# Altium footprint library PcbLib1.PcbLib: 50 footprints (part 3 of 4)
Each footprint in its own frame and in the unit in brackets; x right, y up, seen from the top. Pads: shape width x height; smd on the part's side, far side on the other; paste and mask are expansions set on the pad; w line width, h text height; cw(c..) or ccw(c..) is an arc to the next point about the centre after c.
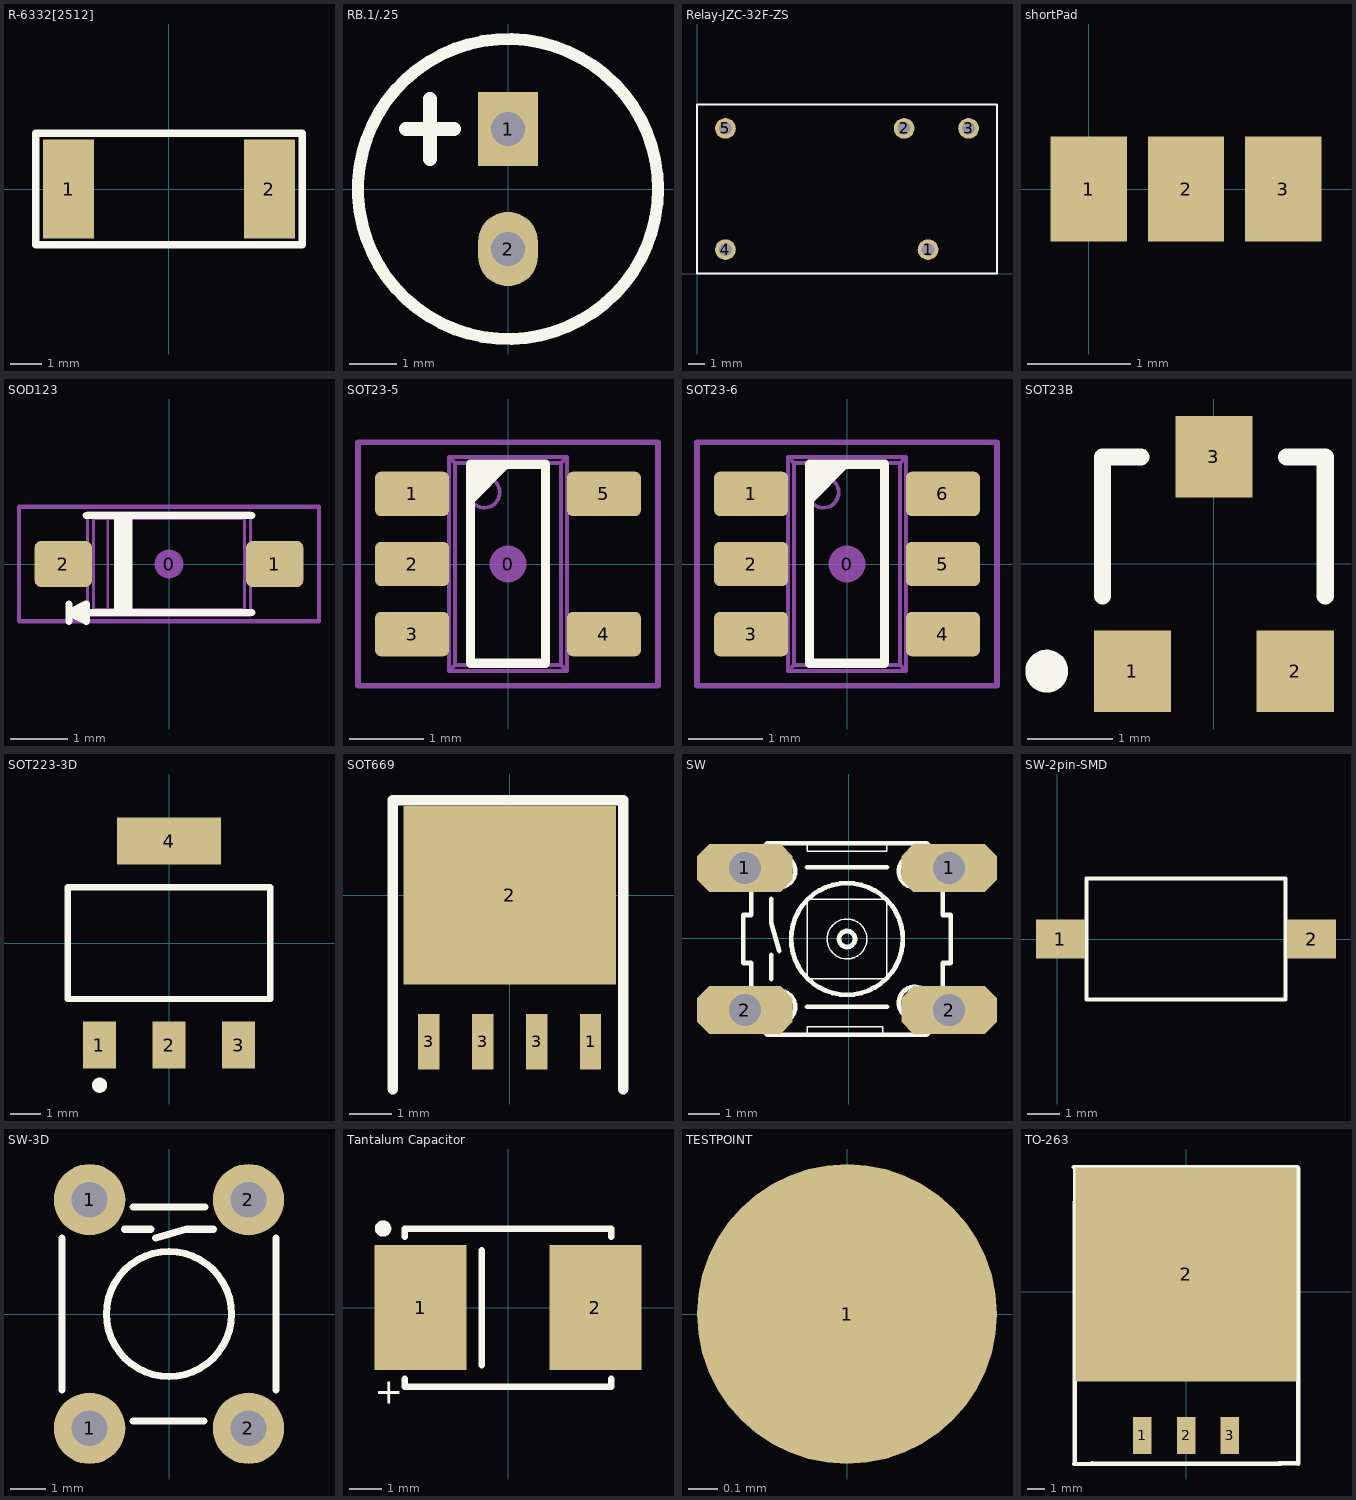
[diagram p2: the footprints below, top view; thin cyan lines are the x and y axes]

## R-6332[2512] [mm] "贴片电阻2512 size6.35*3.2mm"
height 0.65
pads (2):
  rect 1.65x3.2 smd: 1(-3.24,0) 2(3.24,0)
Top Overlay:
  lines w0.254: 4.3,-1.8 -4.3,-1.8 -4.3,1.8 4.3,1.8 ; 4.3,-1.75 4.3,1.75
3D body: height 0.6, standoff -0.04, extent -3.4,-1.651 3.4,1.649

## RB.1/.25 [mil]
pads (2):
  rect 50x62 hole 28: 1(0,50)
  oval 50x62 hole 28: 2(0,-50)
Top Overlay:
  circle w10: c0,0 r125
  lines w12: -85,50 -45,50 ; -65,25 -65,75

## Relay-JZC-32F-ZS [mm]
pads (5):
  round 1.3 hole 0.8: 1(14.48,1.5) 2(12.98,9.1) 3(17.02,9.1) 4(1.78,1.5) 5(1.78,9.1)
Top Overlay:
  lines w0.127: 18.8,10.596 18.8,0 0,0 0,10.6 18.8,10.6

## shortPad [mil] "short pad"
height 10
pads (3):
  rect 29x40 smd: 1(0,0) 2(37,0) 3(74,0)

## SOD123 [mm] "SOD-123; 2 Leads; Body 2.7 x 1.6 mm, (LxW)"
height 1.35
pads (3):
  round 0.508 on Mech15: 0(0,0)
  rrect25% 1x0.8 smd: 1(1.85,0) 2(-1.85,0)
Top Overlay:
  lines w0.127: -1.75,-1 -1.75,-0.7 ; -1.45,0.85 1.45,0.85 ; -0.9,-0.85 -0.9,0.85 ; -0.8,-0.85 -0.8,0.85 ; -0.7,-0.85 -0.7,0.85 ; 1.448,-0.85 -1.45,-0.85 -1.75,-0.85 ; -1.75,-0.85 -1.45,-1 -1.45,-0.7 -1.75,-0.85
Mechanical 13:
  lines w0.05: -1.766,-0.308 -1.766,0.308 ; -1.707,-0.308 -1.707,0.308 ; -1.517,-0.308 -1.517,0.308 ; -1.425,-0.308 -1.95,-0.308 -1.95,0.308 -1.425,0.308 ; 1.425,-0.308 1.95,-0.308 1.95,0.308 1.425,0.308 ; 1.517,-0.308 1.517,0.308 ; 1.707,-0.308 1.707,0.308 ; 1.766,-0.308 1.766,0.308 ; -1.425,-0.9 1.425,-0.9 ; -1.425,-0.9 -1.323,-0.798 ; -1.425,-0.9 -1.425,0.9 ; -1.425,0.9 -1.323,0.798 ; -1.425,0.9 1.425,0.9 ; -1.323,-0.798 -1.072,-0.798 ; -1.323,-0.798 -1.323,0.798 ; -1.323,0.798 -1.072,0.798 ; -1.072,-0.798 1.322,-0.797 ; -1.072,-0.798 -1.072,0.798 ; -1.072,0.798 1.322,0.797 ; 1.322,-0.797 1.322,0.797 ; 1.322,-0.797 1.425,-0.9 ; 1.322,0.797 1.425,0.9 ; 1.425,-0.9 1.425,0.9
Mechanical 15:
  lines w0.076: -2.625,-1 2.625,-1 2.625,1 -2.625,1 -2.625,-1
3D body: height 1.18, standoff 0, extent -1.95,-0.9 1.95,0.9

## SOT23-5 [mm]
height 1.6
pads (6):
  round 0.5 on Mech15: 0(0,0)
  rrect25% 1x0.6 smd: 1(-1.3,0.95) 2(-1.3,0) 3(-1.3,-0.95) 4(1.3,-0.95) 5(1.3,0.95)
Top Overlay:
  region: -0.508,1.353 0.053,1.353 -0.508,0.792
  lines w0.127: -0.508,-1.347 -0.508,1.353 0.508,1.353 0.508,-1.347 -0.508,-1.347
  text "." at -2.275,0.95 h0.1
Mechanical 13:
  circle w0.05: c-0.32,0.97 r0.208
  lines w0.05: -1.191,-1.15 -1.191,-0.75 ; -1.191,-0.2 -1.191,0.2 ; -1.191,0.75 -1.191,1.15 ; -1.1,-1.15 -1.1,-0.75 ; -1.1,-0.2 -1.1,0.2 ; -1.1,0.75 -1.1,1.15 ; -1.094,-1.15 -1.094,-0.75 ; -1.094,-0.2 -1.094,0.2 ; -1.094,0.75 -1.094,1.15 ; -0.844,-1.15 -0.844,-0.75 ; -0.844,-0.2 -0.844,0.2 ; -0.844,0.75 -0.844,1.15 ; -0.8,-1.15 -1.4,-1.15 -1.4,-0.75 -0.8,-0.75 ; -0.8,-0.2 -1.4,-0.2 -1.4,0.2 -0.8,0.2 ; -0.8,0.75 -1.4,0.75 -1.4,1.15 -0.8,1.15 ; 0.8,-1.15 1.4,-1.15 1.4,-0.75 0.8,-0.75 ; 0.8,0.75 1.4,0.75 1.4,1.15 0.8,1.15 ; 0.844,-1.15 0.844,-0.75 ; 0.844,0.75 0.844,1.15 ; 1.094,-1.15 1.094,-0.75 ; 1.094,0.75 1.094,1.15 ; 1.1,-1.15 1.1,-0.75 ; 1.1,0.75 1.1,1.15 ; 1.191,-1.15 1.191,-0.75 ; 1.191,0.75 1.191,1.15 ; -0.8,-1.45 -0.8,1.45 ; -0.8,-1.45 -0.719,-1.369 ; -0.8,-1.45 0.8,-1.45 ; -0.8,1.45 -0.719,1.369 ; -0.8,1.45 0.8,1.45 ; -0.719,-1.369 0.719,-1.369 ; -0.719,-1.369 -0.719,1.369 ; -0.719,1.369 0.719,1.369 ; 0.719,-1.369 0.8,-1.45 ; 0.719,-1.369 0.719,1.369 ; 0.719,1.369 0.8,1.45 ; 0.8,-1.45 0.8,1.45
Mechanical 15:
  lines w0.076: -2.032,-1.651 -2.032,1.651 2.032,1.651 2.032,-1.651 -2.032,-1.651
3D body: height 1.44, standoff -0.01, extent -1.4,-1.45 1.4,1.45

## SOT23-6 [mm]
height 1.6
pads (7):
  round 0.5 on Mech15: 0(0,0)
  rrect25% 1x0.6 smd: 1(-1.3,0.95) 2(-1.3,0) 3(-1.3,-0.95) 4(1.3,-0.95) 5(1.3,0) 6(1.3,0.95)
Top Overlay:
  region: -0.508,1.353 0.053,1.353 -0.508,0.792
  lines w0.127: -0.508,-1.347 0.508,-1.347 0.508,1.353 -0.508,1.353 -0.508,-1.347
  text "." at -2.275,0.95 h0.1
Mechanical 13:
  circle w0.05: c-0.32,0.97 r0.208
  lines w0.05: -1.191,-1.15 -1.191,-0.75 ; -1.191,-0.2 -1.191,0.2 ; -1.191,0.75 -1.191,1.15 ; -1.1,-1.15 -1.1,-0.75 ; -1.1,-0.2 -1.1,0.2 ; -1.1,0.75 -1.1,1.15 ; -1.094,-1.15 -1.094,-0.75 ; -1.094,-0.2 -1.094,0.2 ; -1.094,0.75 -1.094,1.15 ; -0.844,-1.15 -0.844,-0.75 ; -0.844,-0.2 -0.844,0.2 ; -0.844,0.75 -0.844,1.15 ; -0.8,-1.15 -1.4,-1.15 -1.4,-0.75 -0.8,-0.75 ; -0.8,-0.2 -1.4,-0.2 -1.4,0.2 -0.8,0.2 ; -0.8,0.75 -1.4,0.75 -1.4,1.15 -0.8,1.15 ; 0.8,-1.15 1.4,-1.15 1.4,-0.75 0.8,-0.75 ; 0.8,-0.2 1.4,-0.2 1.4,0.2 0.8,0.2 ; 0.8,0.75 1.4,0.75 1.4,1.15 0.8,1.15 ; 0.844,-1.15 0.844,-0.75 ; 0.844,-0.2 0.844,0.2 ; 0.844,0.75 0.844,1.15 ; 1.094,-1.15 1.094,-0.75 ; 1.094,-0.2 1.094,0.2 ; 1.094,0.75 1.094,1.15 ; 1.1,-1.15 1.1,-0.75 ; 1.1,-0.2 1.1,0.2 ; 1.1,0.75 1.1,1.15 ; 1.191,-1.15 1.191,-0.75 ; 1.191,-0.2 1.191,0.2 ; 1.191,0.75 1.191,1.15 ; -0.8,-1.45 -0.8,1.45 ; -0.8,-1.45 -0.719,-1.369 ; -0.8,-1.45 0.8,-1.45 ; -0.8,1.45 -0.719,1.369 ; -0.8,1.45 0.8,1.45 ; -0.719,-1.369 0.719,-1.369 ; -0.719,-1.369 -0.719,1.369 ; -0.719,1.369 0.719,1.369 ; 0.719,-1.369 0.8,-1.45 ; 0.719,-1.369 0.719,1.369 ; 0.719,1.369 0.8,1.45 ; 0.8,-1.45 0.8,1.45
Mechanical 15:
  lines w0.076: -2.032,-1.651 2.032,-1.651 2.032,1.651 -2.032,1.651 -2.032,-1.651
3D body: height 1.44, standoff -0.01, extent -1.4,-1.45 1.4,1.45

## SOT23B [mm] "SOT-23; 3 Leads; Body 3.0 x 2.6 mm, inc. leads (LxW max)"
height 1.1
pads (3):
  rect 0.9x0.95 smd: 1(-0.95,-1.25) 2(0.95,-1.25) 3(0,1.25)
Top Overlay:
  circle w0.25: c-1.95,-1.25 r0.125
  lines w0.2: -1.3,-0.375 -1.3,1.25 -0.85,1.25 ; 0.85,1.25 1.3,1.25 1.3,-0.375
3D body: height 1.1, standoff 0, extent -1.524,-1.27 1.476,1.272

## SOT223-3D [mm] "SOT-223/SC-73; 4 Leads; Body 6.7 x 7.3 mm, inc. leads (LxW max)"
height 1.8
pads (4):
  rect 1.1x1.55 smd: 1(-2.3,-3.375) 2(0,-3.375) 3(2.3,-3.375)
  rect 3.45x1.55 smd: 4(0,3.375)
Top Overlay:
  circle w0.25: c-2.3,-4.7 r0.125
  lines w0.2: -3.35,-1.85 -3.35,1.85 3.35,1.85 3.35,-1.85 -3.35,-1.85
3D body: height 1.66, standoff -0.02, extent -3.325,-3.48 3.175,3.48

## SOT669 [mm] "PSMN7R0-30YL  NMOS"
height 1.2
pads (5):
  rect 0.5x1.3 smd: 1(1.905,-3.45) 3(-1.905,-3.45) 3(-0.635,-3.45) 3(0.635,-3.45)
  rect 5x4.2 smd: 2(0,0)
Top Overlay:
  lines w0.254: -2.753,-4.564 -2.753,2.233 -2.73,2.233 ; -2.697,2.233 2.672,2.233 2.672,-4.564
3D body: height 1.15, standoff -0.05, extent -2.487,-4.23 2.413,2.198

## SW [mil] "引脚间距6.5mmX4."
height 196.85
pads (4):
  oct 120x60 hole 40: 1(-130,88) 1(126,88) 2(-130,-90) 2(126,-90)
Top Overlay:
  circle w6: c-2,-1 r10
  circle w2: c-2,-1 r25
  circle w6: c-87,84 r20
  circle w6: c83,84 r20
  circle w6: c83,-81 r20
  circle w6: c-87,-86 r20
  circle w6: c-2,-1 r70
  lines w2: -52,-121 -52,-111 43,-111 43,-121 ; -52,119 -52,109 48,109 48,119 ; -52,-51 48,-51 48,49 -52,49 -52,-51
  lines w6: -97,-51 -97,-21 ; -97,49 -97,19 -87,-16 ; -52,-86 48,-86 ; -52,89 48,89 ; -132,-31 -122,-31 -122,-41 -122,-101 -102,-121 -87,-121 -52,-121 43,-121 83,-121 98,-121 118,-101 118,-41 118,-31 128,-31 128,29 118,29 118,39 118,99 98,119 83,119 48,119 -52,119 -87,119 -102,119 -122,99 -122,39 -122,29 -132,29 -132,-31

## SW-2pin-SMD [mm] "3*6*2.5mm Button"
pads (2):
  rect 1.5x1.2 smd: 1(0.1,0) 2(7.8,0)
Top Overlay:
  lines w0.127: 7,1.846 7,-1.85 0.9,-1.85 0.9,1.85 7,1.85
3D body: height 2.5, standoff 0, extent -0.076,-1.803 7.924,1.797

## SW-3D [mil]
pads (4):
  round 80 hole 40: 1(-89,-128) 1(-89,128) 2(89,-128) 2(89,128)
Top Overlay:
  circle w8: c0,0 r70
  lines w8: -120,-85 -120,85 ; -50,95 -20,95 ; -40,-120 39.29,-120 ; -40,120 40.47,120 ; -15,85 20,95 50,95 ; 120,-85 120,85
3D body: height 212.6, standoff -118.11, extent -118.11,-161.65 118.11,161.65

## Tantalum Capacitor [mil] "Capacitor, SM Tantalum; Body 6.0 x 3.2 mm (LxW typ)"
height 133.86
pads (2):
  rect 110x150 smd: 1(-105,0) 2(105,0)
Top Overlay:
  circle w9.84: c-149.92,95 r4.92
  lines w7.87: -124.02,-85 -124.02,-95 124.02,-95 124.02,-85 ; -124.02,85 -124.02,95 124.02,95 124.02,85 ; -31.5,-68.9 -31.5,68.9
  text "+" at -160,-115 h30

## TESTPOINT [mil]
pads (1):
  round 40 smd: 1(0,0)

## TO-263 [mm] "TO-263"
height 1.27
pads (4):
  rect 1.07x2.16 smd: 1(-2.54,-8.325) 2(0,-8.325) 3(2.54,-8.325)
  rect 12.8x12.41 smd: 2(0,1)
Top Overlay:
  lines w0.254: -6.495,-9.977 -5.298,-9.977 ; -6.462,7.186 -6.505,7.229 -5.446,7.229 ; -6.446,-9.929 -6.446,5.215 ; -6.439,5.179 -6.439,7.186 ; -5.446,-9.929 -5.418,-9.957 5.491,-9.957 ; -5.433,7.227 5.491,7.227 ; 5.329,7.229 6.429,7.229 6.469,7.188 ; 5.37,-9.939 6.342,-9.939 ; 6.469,7.165 6.49,7.145 6.49,5.222 ; 6.491,-9.957 6.491,5.227